# Altium schematic symbol library My_Intlib.SchLib: 107 symbols (part 2 of 2)
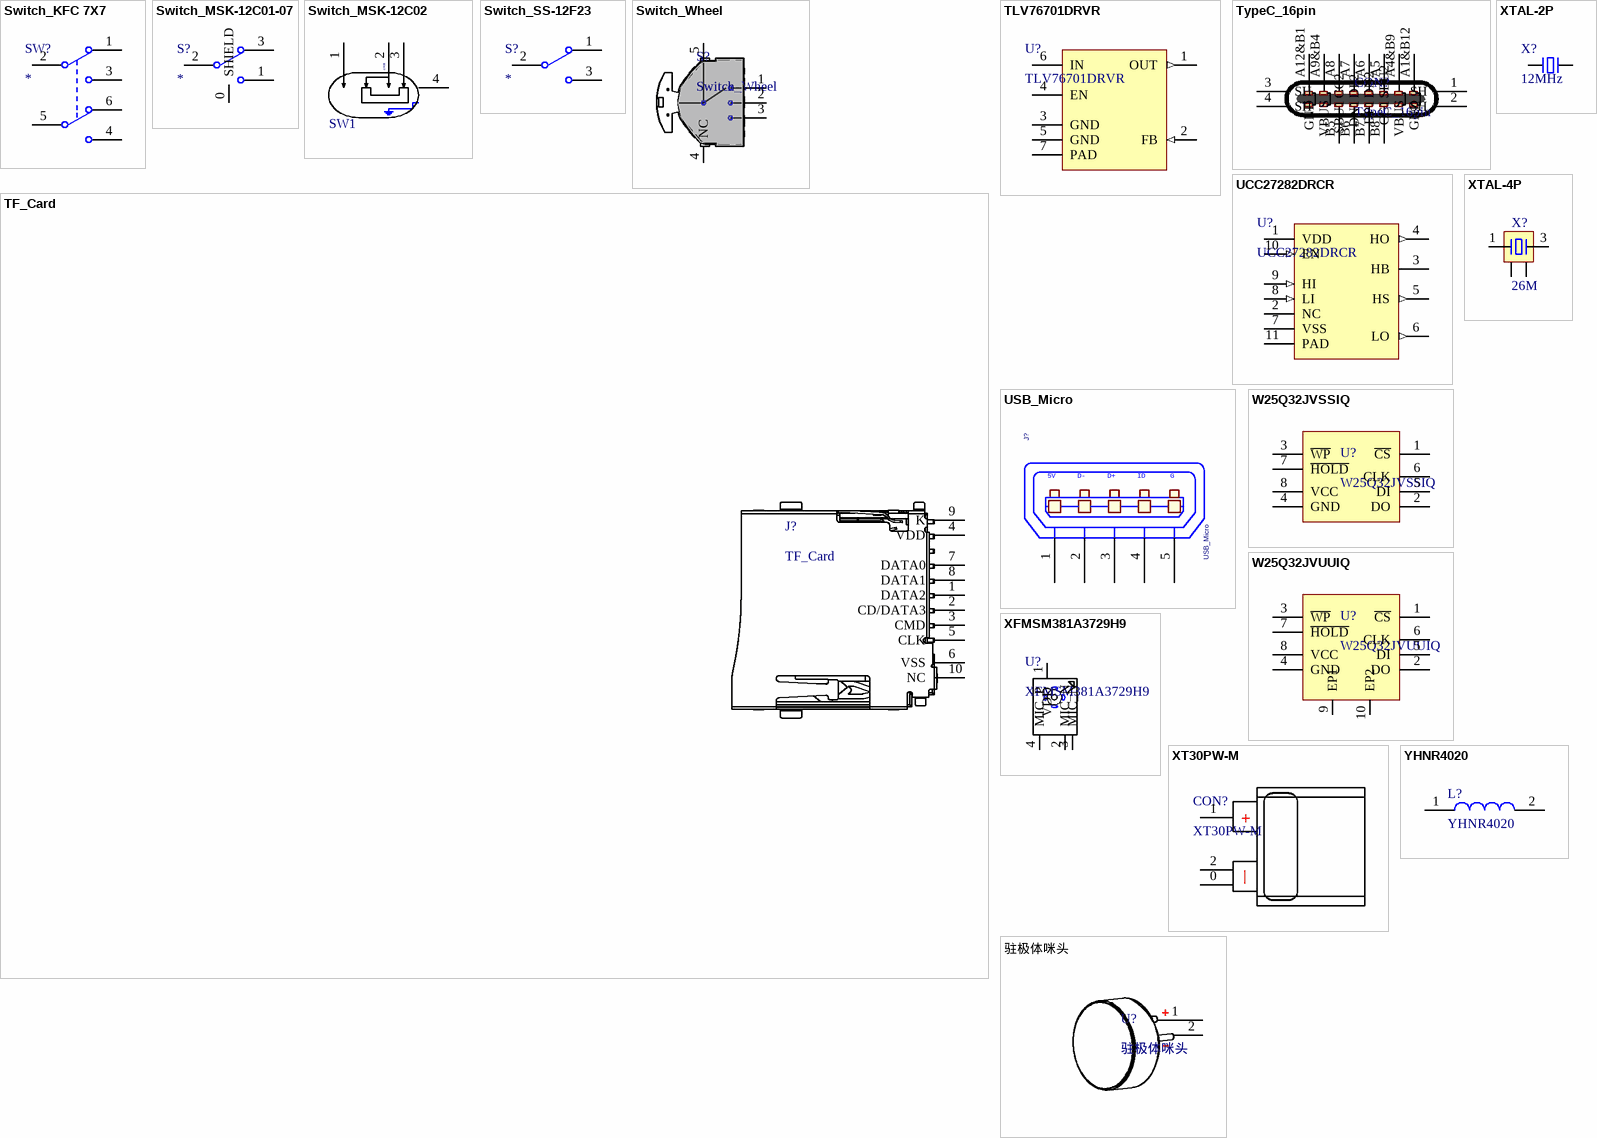
[diagram p8: symbols Switch_KFC 7X7 to 驻极体咪头]

## XTAL-2P
designator X?, comment 12MHz
2脚无源脚晶振; 版权归属: 源创客; 负载电容: CL20pF; BOM名称: 2脚无源脚晶振; 学习资源: www.ooocke.com
footprint OSC HC-49S
footprint OSC HC-49SMD
footprint OSC-32.768KHz (脚距：1.0mm)
footprint OSC 3215-2P (3.2*1.5*0.6mm(长宽高))
pins: 1, 2

## XTAL-4P
designator X?, comment 26M
4脚无源晶振; 负载电容: CL20pF; BOM名称: 4脚无源晶振
footprint OSC 3225-4P (3.2*2.5*0.7mm(长宽高))
footprint OSC 2016-4P (3.2*2.5*0.7mm(长宽高))
pins: 1, 2, 3, 4

## YHNR4020
designator L?
10uH电感，2.4A，160mΩ
footprint YHNR4020
pins: 1, 2

## 驻极体咪头
designator U?
驻极体咪头，直径6mm*厚度2.2mm，灵敏度-48~66dB，频响范围50~20KHz，全指向，最大500uA，额定3V，工作范围1.5~10V
footprint 咪头6*2.2mm (驻极体咪头，直径6mm*厚度2.2mm，灵敏度-48~66dB，频响范围50~20KHz，全指向，最大500uA，额定3V，工作范围1.5~10V)
pins: 1, 2